# Altium footprint library PcbLib_ICs.PcbLib: 317 footprints (part 11 of 24)
Each footprint in its own frame and in the unit in brackets; x right, y up, seen from the top. Pads: shape width x height; smd on the part's side, far side on the other; paste and mask are expansions set on the pad; w line width, h text height; cw(c..) or ccw(c..) is an arc to the next point about the centre after c.
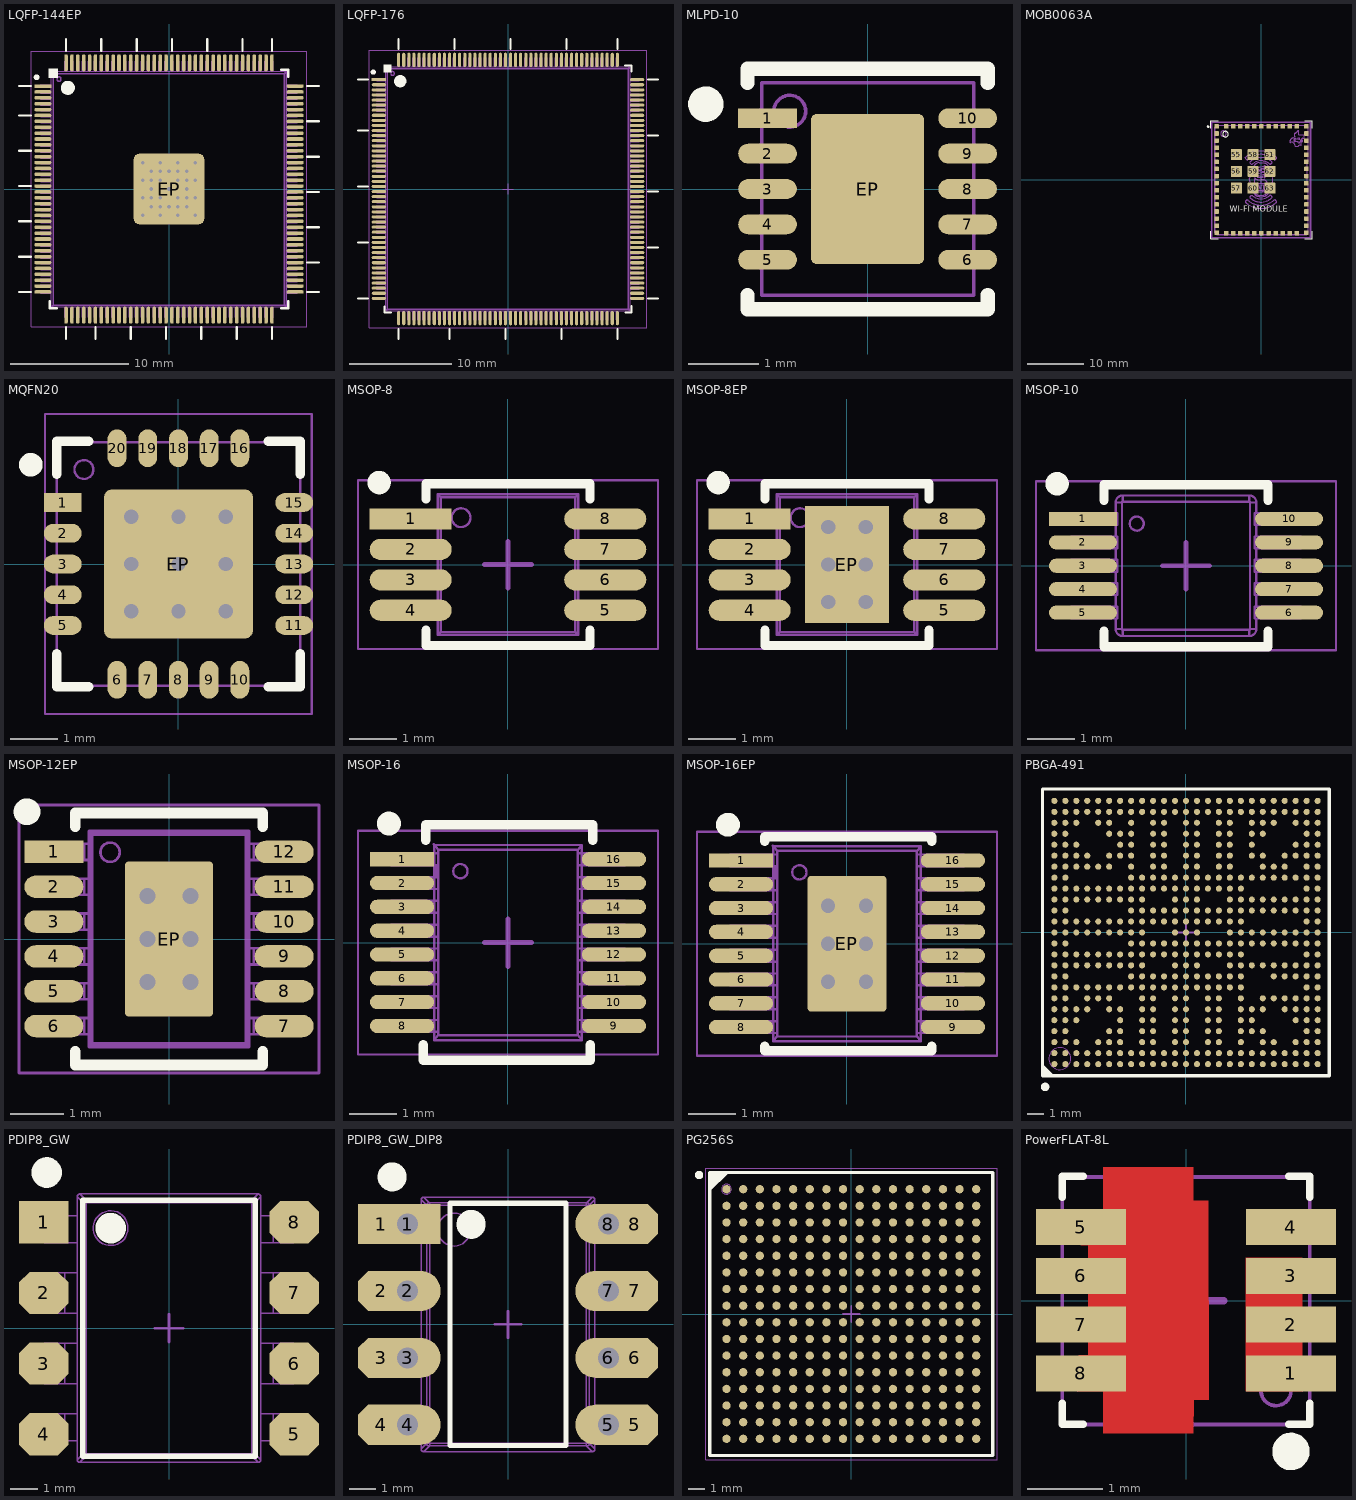
[diagram p10: the footprints below, top view; thin cyan lines are the x and y axes]

## LQFP-144EP [mm] "TSQFP, 144-Leads, Body 20,00x20,00mm, Pitch 0,50mm, IPC Medium Density"
height 1.6
pads (145):
  rect 1.45x0.3 smd paste+0 mask+0.08: 1(-10.725,8.75)
  oval 1.45x0.3 smd paste+0 mask+0.08: 2(-10.725,8.25) 3(-10.725,7.75) 4(-10.725,7.25) 5(-10.725,6.75) 6(-10.725,6.25) 7(-10.725,5.75) 8(-10.725,5.25) 9(-10.725,4.75) 10(-10.725,4.25) 11(-10.725,3.75) 12(-10.725,3.25) 13(-10.725,2.75) 14(-10.725,2.25) 15(-10.725,1.75) 16(-10.725,1.25) 17(-10.725,0.75) 18(-10.725,0.25) 19(-10.725,-0.25) 20(-10.725,-0.75) 21(-10.725,-1.25) 22(-10.725,-1.75) 23(-10.725,-2.25) 24(-10.725,-2.75) 25(-10.725,-3.25) 26(-10.725,-3.75) 27(-10.725,-4.25) 28(-10.725,-4.75) 29(-10.725,-5.25) 30(-10.725,-5.75) 31(-10.725,-6.25) 32(-10.725,-6.75) 33(-10.725,-7.25) 34(-10.725,-7.75) 35(-10.725,-8.25) 36(-10.725,-8.75) 73(10.725,-8.75) 74(10.725,-8.25) 75(10.725,-7.75) 76(10.725,-7.25) 77(10.725,-6.75) 78(10.725,-6.25) 79(10.725,-5.75) 80(10.725,-5.25) 81(10.725,-4.75) 82(10.725,-4.25) 83(10.725,-3.75) 84(10.725,-3.25) 85(10.725,-2.75) 86(10.725,-2.25) 87(10.725,-1.75) 88(10.725,-1.25) 89(10.725,-0.75) 90(10.725,-0.25) 91(10.725,0.25) 92(10.725,0.75) 93(10.725,1.25) 94(10.725,1.75) 95(10.725,2.25) 96(10.725,2.75) 97(10.725,3.25) 98(10.725,3.75) 99(10.725,4.25) 100(10.725,4.75) 101(10.725,5.25) 102(10.725,5.75) 103(10.725,6.25) 104(10.725,6.75) 105(10.725,7.25) 106(10.725,7.75) 107(10.725,8.25) 108(10.725,8.75)
  oval 0.3x1.45 smd paste+0 mask+0.08: 37(-8.75,-10.725) 38(-8.25,-10.725) 39(-7.75,-10.725) 40(-7.25,-10.725) 41(-6.75,-10.725) 42(-6.25,-10.725) 43(-5.75,-10.725) 44(-5.25,-10.725) 45(-4.75,-10.725) 46(-4.25,-10.725) 47(-3.75,-10.725) 48(-3.25,-10.725) 49(-2.75,-10.725) 50(-2.25,-10.725) 51(-1.75,-10.725) 52(-1.25,-10.725) 53(-0.75,-10.725) 54(-0.25,-10.725) 55(0.25,-10.725) 56(0.75,-10.725) 57(1.25,-10.725) 58(1.75,-10.725) 59(2.25,-10.725) 60(2.75,-10.725) 61(3.25,-10.725) 62(3.75,-10.725) 63(4.25,-10.725) 64(4.75,-10.725) 65(5.25,-10.725) 66(5.75,-10.725) 67(6.25,-10.725) 68(6.75,-10.725) 69(7.25,-10.725) 70(7.75,-10.725) 71(8.25,-10.725) 72(8.75,-10.725) 109(8.75,10.725) 110(8.25,10.725) 111(7.75,10.725) 112(7.25,10.725) 113(6.75,10.725) 114(6.25,10.725) 115(5.75,10.725) 116(5.25,10.725) 117(4.75,10.725) 118(4.25,10.725) 119(3.75,10.725) 120(3.25,10.725) 121(2.75,10.725) 122(2.25,10.725) 123(1.75,10.725) 124(1.25,10.725) 125(0.75,10.725) 126(0.25,10.725) 127(-0.25,10.725) 128(-0.75,10.725) 129(-1.25,10.725) 130(-1.75,10.725) 131(-2.25,10.725) 132(-2.75,10.725) 133(-3.25,10.725) 134(-3.75,10.725) 135(-4.25,10.725) 136(-4.75,10.725) 137(-5.25,10.725) 138(-5.75,10.725) 139(-6.25,10.725) 140(-6.75,10.725) 141(-7.25,10.725) 142(-7.75,10.725) 143(-8.25,10.725) 144(-8.75,10.725)
  rrect15% 6x6 smd paste-50 mask+0.08: EP(0,0)
via -1.5,0.75 diameter 0.7 hole 0.3
via -1.5,-0.75 diameter 0.7 hole 0.3
via -2.25,0.75 diameter 0.7 hole 0.3
via -0.75,2.25 diameter 0.7 hole 0.3
via -2.25,2.25 diameter 0.7 hole 0.3
via -2.25,-0.75 diameter 0.7 hole 0.3
via -0.75,-2.25 diameter 0.7 hole 0.3
via -2.25,-2.25 diameter 0.7 hole 0.3
via -1.5,-1.5 diameter 0.7 hole 0.3
via -0.75,-0.75 diameter 0.7 hole 0.3
via 0.75,-2.25 diameter 0.7 hole 0.3
via 2.25,-0.75 diameter 0.7 hole 0.3
via 2.25,-2.25 diameter 0.7 hole 0.3
via 1.5,-1.5 diameter 0.7 hole 0.3
via 0.75,-0.75 diameter 0.7 hole 0.3
via 2.25,0.75 diameter 0.7 hole 0.3
via 0.75,2.25 diameter 0.7 hole 0.3
via 2.25,2.25 diameter 0.7 hole 0.3
via 1.5,1.5 diameter 0.7 hole 0.3
via 0.75,0.75 diameter 0.7 hole 0.3
via 0,0 diameter 0.7 hole 0.3
via -0.75,-1.5 diameter 0.7 hole 0.3
via 0.75,-1.5 diameter 0.7 hole 0.3
via 1.5,-0.75 diameter 0.7 hole 0.3
via 1.5,0.75 diameter 0.7 hole 0.3
via 0.75,1.5 diameter 0.7 hole 0.3
via -0.75,1.5 diameter 0.7 hole 0.3
via 0,1.5 diameter 0.7 hole 0.3
via -1.5,0 diameter 0.7 hole 0.3
via 0,-1.5 diameter 0.7 hole 0.3
via 1.5,0 diameter 0.7 hole 0.3
via -0.75,0.75 diameter 0.7 hole 0.3
via -1.5,1.5 diameter 0.7 hole 0.3
Top Overlay:
  circle w0.25: c-11.25,9.5 r0.125
  circle w0.6: c-8.6,8.6 r0.3
  rectangle: -10.25,9.45 -9.45,10.25
  lines w0.2: -12.75,-8.75 -11.75,-8.75 ; -12.75,-5.75 -11.75,-5.75 ; -12.75,-2.75 -11.75,-2.75 ; -12.75,0.25 -11.75,0.25 ; -12.75,3.25 -11.75,3.25 ; -12.75,6.25 -11.75,6.25 ; -12.75,8.75 -11.75,8.75 ; -10.15,-9.55 -10.15,-10.15 -9.525,-10.15 ; -8.75,-12.75 -8.75,-11.75 ; -8.75,11.75 -8.75,12.75 ; -6.25,-12.75 -6.25,-11.75 ; -5.75,11.75 -5.75,12.75 ; -3.25,-12.75 -3.25,-11.75 ; -2.75,11.75 -2.75,12.75 ; -0.25,-12.75 -0.25,-11.75 ; 0.25,11.75 0.25,12.75 ; 2.75,-12.75 2.75,-11.75 ; 3.25,11.75 3.25,12.75 ; 5.75,-12.75 5.75,-11.75 ; 6.25,11.75 6.25,12.75 ; 8.75,-12.75 8.75,-11.75 ; 8.75,11.75 8.75,12.75 ; 9.525,10.15 10.15,10.15 10.15,9.55 ; 9.55,-10.15 10.15,-10.15 10.15,-9.525 ; 11.75,-8.75 12.75,-8.75 ; 11.75,-6.25 12.75,-6.25 ; 11.75,-3.25 12.75,-3.25 ; 11.75,-0.25 12.75,-0.25 ; 11.75,2.75 12.75,2.75 ; 11.75,5.75 12.75,5.75 ; 11.75,8.75 12.75,8.75
Top Paste:
  rectangle: 0.1,-0.7 0.7,-0.1
  rectangle: -0.7,-0.7 -0.1,-0.1
  rectangle: 0.1,0.1 0.7,0.7
  rectangle: -0.7,0.1 -0.1,0.7
  rectangle: -1.5,-0.7 -0.9,-0.1
  rectangle: -2.3,-0.7 -1.7,-0.1
  rectangle: -1.5,0.1 -0.9,0.7
  rectangle: -2.3,0.1 -1.7,0.7
  rectangle: 1.7,-0.7 2.3,-0.1
  rectangle: 0.9,-0.7 1.5,-0.1
  rectangle: 1.7,0.1 2.3,0.7
  rectangle: 0.9,0.1 1.5,0.7
  rectangle: -3.1,-0.7 -2.5,-0.1
  rectangle: -3.1,0.1 -2.5,0.7
  region: 3.1,0.7 2.5,0.7 2.5,0.1 3.1,0.1
  region: 3.1,-0.1 2.5,-0.1 2.5,-0.7 3.1,-0.7
  rectangle: 0.1,0.9 0.7,1.5
  rectangle: -0.7,0.9 -0.1,1.5
  rectangle: -1.5,0.9 -0.9,1.5
  rectangle: -2.3,0.9 -1.7,1.5
  rectangle: 1.7,0.9 2.3,1.5
  rectangle: 0.9,0.9 1.5,1.5
  rectangle: -3.1,0.9 -2.5,1.5
  region: 3.1,1.5 2.5,1.5 2.5,0.9 3.1,0.9
  rectangle: 0.1,1.7 0.7,2.3
  rectangle: -0.7,1.7 -0.1,2.3
  rectangle: -1.5,1.7 -0.9,2.3
  rectangle: -2.3,1.7 -1.7,2.3
  rectangle: 1.7,1.7 2.3,2.3
  rectangle: 0.9,1.7 1.5,2.3
  rectangle: -3.1,1.7 -2.5,2.3
  region: 3.1,2.3 2.5,2.3 2.5,1.7 3.1,1.7
  rectangle: 0.1,2.5 0.7,3.1
  rectangle: -0.7,2.5 -0.1,3.1
  rectangle: -1.5,2.5 -0.9,3.1
  rectangle: -2.3,2.5 -1.7,3.1
  rectangle: 1.7,2.5 2.3,3.1
  rectangle: 0.9,2.5 1.5,3.1
  rectangle: -3.1,2.5 -2.5,3.1
  region: 3.1,3.1 2.5,3.1 2.5,2.5 3.1,2.5
  region: -0.1,-0.9 -0.7,-0.9 -0.7,-1.5 -0.1,-1.5
  region: 0.7,-0.9 0.1,-0.9 0.1,-1.5 0.7,-1.5
  region: 1.5,-0.9 0.9,-0.9 0.9,-1.5 1.5,-1.5
  region: 2.3,-0.9 1.7,-0.9 1.7,-1.5 2.3,-1.5
  region: -1.7,-0.9 -2.3,-0.9 -2.3,-1.5 -1.7,-1.5
  region: -0.9,-0.9 -1.5,-0.9 -1.5,-1.5 -0.9,-1.5
  region: 3.1,-0.9 2.5,-0.9 2.5,-1.5 3.1,-1.5
  rectangle: -3.1,-1.5 -2.5,-0.9
  region: -0.1,-1.7 -0.7,-1.7 -0.7,-2.3 -0.1,-2.3
  region: 0.7,-1.7 0.1,-1.7 0.1,-2.3 0.7,-2.3
  region: 1.5,-1.7 0.9,-1.7 0.9,-2.3 1.5,-2.3
  region: 2.3,-1.7 1.7,-1.7 1.7,-2.3 2.3,-2.3
  region: -1.7,-1.7 -2.3,-1.7 -2.3,-2.3 -1.7,-2.3
  region: -0.9,-1.7 -1.5,-1.7 -1.5,-2.3 -0.9,-2.3
  region: 3.1,-1.7 2.5,-1.7 2.5,-2.3 3.1,-2.3
  rectangle: -3.1,-2.3 -2.5,-1.7
  region: -0.1,-2.5 -0.7,-2.5 -0.7,-3.1 -0.1,-3.1
  region: 0.7,-2.5 0.1,-2.5 0.1,-3.1 0.7,-3.1
  region: 1.5,-2.5 0.9,-2.5 0.9,-3.1 1.5,-3.1
  region: 2.3,-2.5 1.7,-2.5 1.7,-3.1 2.3,-3.1
  region: -1.7,-2.5 -2.3,-2.5 -2.3,-3.1 -1.7,-3.1
  region: -0.9,-2.5 -1.5,-2.5 -1.5,-3.1 -0.9,-3.1
  region: 3.1,-2.5 2.5,-2.5 2.5,-3.1 3.1,-3.1
  rectangle: -3.1,-3.1 -2.5,-2.5
Bottom Solder:
  region: -3.25,3.25 -0.5,3.25 0,2.75 0.5,3.25 3.25,3.25 3.25,0.5 2.75,0 3.25,-0.5 3.25,-3.25 0.5,-3.25 0,-2.75 -0.5,-3.25 -3.25,-3.25 -3.25,-0.5 -2.75,0 -3.25,0.5
Top Assy:
  drawing of 2361 lines, arcs and shapes, not listed
  text ".Designator" at -3.443,-0.467 h2
Top Text:
  lines w0.05: -11.7,-11.7 -11.7,11.7 11.7,11.7 11.7,-11.7 -11.7,-11.7
  lines w0.1: -0.5,0 0.5,0 ; 0,-0.5 0,0.5
3D body "LQFP144-0_5.STEP": height 1.58, standoff 0.01, extent -10.875,-10.872 10.897,10.9

## LQFP-176 [mm] "TSQFP, 176-Leads, Body 24,00x24,00mm, Pitch 0,50mm, IPC Medium Density"
height 1.6
pads (176):
  rect 1.4x0.3 smd paste+0 mask+0.08: 1(-12.7,10.75)
  oval 1.4x0.3 smd paste+0 mask+0.08: 2(-12.7,10.25) 3(-12.7,9.75) 4(-12.7,9.25) 5(-12.7,8.75) 6(-12.7,8.25) 7(-12.7,7.75) 8(-12.7,7.25) 9(-12.7,6.75) 10(-12.7,6.25) 11(-12.7,5.75) 12(-12.7,5.25) 13(-12.7,4.75) 14(-12.7,4.25) 15(-12.7,3.75) 16(-12.7,3.25) 17(-12.7,2.75) 18(-12.7,2.25) 19(-12.7,1.75) 20(-12.7,1.25) 21(-12.7,0.75) 22(-12.7,0.25) 23(-12.7,-0.25) 24(-12.7,-0.75) 25(-12.7,-1.25) 26(-12.7,-1.75) 27(-12.7,-2.25) 28(-12.7,-2.75) 29(-12.7,-3.25) 30(-12.7,-3.75) 31(-12.7,-4.25) 32(-12.7,-4.75) 33(-12.7,-5.25) 34(-12.7,-5.75) 35(-12.7,-6.25) 36(-12.7,-6.75) 37(-12.7,-7.25) 38(-12.7,-7.75) 39(-12.7,-8.25) 40(-12.7,-8.75) 41(-12.7,-9.25) 42(-12.7,-9.75) 43(-12.7,-10.25) 44(-12.7,-10.75) 89(12.7,-10.75) 90(12.7,-10.25) 91(12.7,-9.75) 92(12.7,-9.25) 93(12.7,-8.75) 94(12.7,-8.25) 95(12.7,-7.75) 96(12.7,-7.25) 97(12.7,-6.75) 98(12.7,-6.25) 99(12.7,-5.75) 100(12.7,-5.25) 101(12.7,-4.75) 102(12.7,-4.25) 103(12.7,-3.75) 104(12.7,-3.25) 105(12.7,-2.75) 106(12.7,-2.25) 107(12.7,-1.75) 108(12.7,-1.25) 109(12.7,-0.75) 110(12.7,-0.25) 111(12.7,0.25) 112(12.7,0.75) 113(12.7,1.25) 114(12.7,1.75) 115(12.7,2.25) 116(12.7,2.75) 117(12.7,3.25) 118(12.7,3.75) 119(12.7,4.25) 120(12.7,4.75) 121(12.7,5.25) 122(12.7,5.75) 123(12.7,6.25) 124(12.7,6.75) 125(12.7,7.25) 126(12.7,7.75) 127(12.7,8.25) 128(12.7,8.75) 129(12.7,9.25) 130(12.7,9.75) 131(12.7,10.25) 132(12.7,10.75)
  oval 0.3x1.4 smd paste+0 mask+0.08: 45(-10.75,-12.7) 46(-10.25,-12.7) 47(-9.75,-12.7) 48(-9.25,-12.7) 49(-8.75,-12.7) 50(-8.25,-12.7) 51(-7.75,-12.7) 52(-7.25,-12.7) 53(-6.75,-12.7) 54(-6.25,-12.7) 55(-5.75,-12.7) 56(-5.25,-12.7) 57(-4.75,-12.7) 58(-4.25,-12.7) 59(-3.75,-12.7) 60(-3.25,-12.7) 61(-2.75,-12.7) 62(-2.25,-12.7) 63(-1.75,-12.7) 64(-1.25,-12.7) 65(-0.75,-12.7) 66(-0.25,-12.7) 67(0.25,-12.7) 68(0.75,-12.7) 69(1.25,-12.7) 70(1.75,-12.7) 71(2.25,-12.7) 72(2.75,-12.7) 73(3.25,-12.7) 74(3.75,-12.7) 75(4.25,-12.7) 76(4.75,-12.7) 77(5.25,-12.7) 78(5.75,-12.7) 79(6.25,-12.7) 80(6.75,-12.7) 81(7.25,-12.7) 82(7.75,-12.7) 83(8.25,-12.7) 84(8.75,-12.7) 85(9.25,-12.7) 86(9.75,-12.7) 87(10.25,-12.7) 88(10.75,-12.7) 133(10.75,12.7) 134(10.25,12.7) 135(9.75,12.7) 136(9.25,12.7) 137(8.75,12.7) 138(8.25,12.7) 139(7.75,12.7) 140(7.25,12.7) 141(6.75,12.7) 142(6.25,12.7) 143(5.75,12.7) 144(5.25,12.7) 145(4.75,12.7) 146(4.25,12.7) 147(3.75,12.7) 148(3.25,12.7) 149(2.75,12.7) 150(2.25,12.7) 151(1.75,12.7) 152(1.25,12.7) 153(0.75,12.7) 154(0.25,12.7) 155(-0.25,12.7) 156(-0.75,12.7) 157(-1.25,12.7) 158(-1.75,12.7) 159(-2.25,12.7) 160(-2.75,12.7) 161(-3.25,12.7) 162(-3.75,12.7) 163(-4.25,12.7) 164(-4.75,12.7) 165(-5.25,12.7) 166(-5.75,12.7) 167(-6.25,12.7) 168(-6.75,12.7) 169(-7.25,12.7) 170(-7.75,12.7) 171(-8.25,12.7) 172(-8.75,12.7) 173(-9.25,12.7) 174(-9.75,12.7) 175(-10.25,12.7) 176(-10.75,12.7)
Top Overlay:
  circle w0.25: c-13.25,11.5 r0.125
  circle w0.6: c-10.6,10.6 r0.3
  rectangle: -12.25,11.45 -11.45,12.25
  lines w0.2: -14.75,-10.75 -13.75,-10.75 ; -14.75,-5.25 -13.75,-5.25 ; -14.75,0.25 -13.75,0.25 ; -14.75,5.75 -13.75,5.75 ; -14.75,10.75 -13.75,10.75 ; -12.15,-11.55 -12.15,-12.15 -11.525,-12.15 ; -10.75,-14.75 -10.75,-13.75 ; -10.75,13.75 -10.75,14.75 ; -5.75,-14.75 -5.75,-13.75 ; -5.25,13.75 -5.25,14.75 ; -0.25,-14.75 -0.25,-13.75 ; 0.25,13.75 0.25,14.75 ; 5.25,-14.75 5.25,-13.75 ; 5.75,13.75 5.75,14.75 ; 10.75,-14.75 10.75,-13.75 ; 10.75,13.75 10.75,14.75 ; 11.525,12.15 12.15,12.15 12.15,11.55 ; 11.55,-12.15 12.15,-12.15 12.15,-11.525 ; 13.75,-10.75 14.75,-10.75 ; 13.75,-5.75 14.75,-5.75 ; 13.75,-0.25 14.75,-0.25 ; 13.75,5.25 14.75,5.25 ; 13.75,10.75 14.75,10.75
Top Assy:
  drawing of 2873 lines, arcs and shapes, not listed
  text ".Designator" at -3.443,-0.467 h2
Top Text:
  lines w0.05: -13.65,-13.65 -13.65,13.65 13.65,13.65 13.65,-13.65 -13.65,-13.65
  lines w0.1: -0.5,0 0.5,0 ; 0,-0.5 0,0.5
3D body "LQFP176-0_5.STEP": height 1.58, standoff 0.01, extent -12.875,-12.872 12.897,12.9

## MLPD-10 [mm]
height 1
pads (11):
  rect 0.83x0.28 smd paste+0 mask+0.05: 1(-1.415,1)
  oval 0.83x0.28 smd paste+0 mask+0.05: 2(-1.415,0.5) 3(-1.415,0) 4(-1.415,-0.5) 5(-1.415,-1) 6(1.415,-1) 7(1.415,-0.5) 8(1.415,0) 9(1.415,0.5) 10(1.415,1)
  rrect10% 1.6x2.12 smd paste-50 mask+0.05: EP(0,0)
Top Overlay:
  circle w0.25: c-2.288,1.2 r0.125
  lines w0.2: -1.7,-1.5 -1.7,-1.7 1.7,-1.7 1.7,-1.5 ; -1.7,1.5 -1.7,1.7 1.7,1.7 1.7,1.5
Top Paste:
  rectangle: -0.7,-1.1 -0.1,-0.5
  rectangle: 0.1,-1.1 0.7,-0.5
  region: 0.7,1.1 0.1,1.1 0.1,0.5 0.7,0.5
  region: -0.1,1.1 -0.7,1.1 -0.7,0.5 -0.1,0.5
  rectangle: -0.7,-0.3 -0.1,0.3
  rectangle: 0.1,-0.3 0.7,0.3
Bottom Solder:
  region: -0.8,1.05 -0.125,1.05 0,0.925 0.125,1.05 0.8,1.05 0.8,0.15 0.675,0.025 0.8,-0.1 0.8,-1.05 0.125,-1.05 0,-0.925 -0.125,-1.05 -0.8,-1.05 -0.8,-0.1 -0.675,0.025 -0.8,0.15
Top Assy:
  circle w0.05: c-1.1,1.1 r0.225
  lines w0.05: -1.5,-1.115 -1.525,-1.115 -1.525,-0.885 -1.5,-0.885 ; -1.5,-0.615 -1.525,-0.615 -1.525,-0.385 -1.5,-0.385 ; -1.5,-0.115 -1.525,-0.115 -1.525,0.115 -1.5,0.115 ; -1.5,0.385 -1.525,0.385 -1.525,0.615 -1.5,0.615 ; -1.5,0.885 -1.525,0.885 -1.525,1.115 -1.5,1.115 ; 1.5,-1.115 1.525,-1.115 1.525,-0.885 1.5,-0.885 ; 1.5,-0.615 1.525,-0.615 1.525,-0.385 1.5,-0.385 ; 1.5,-0.115 1.525,-0.115 1.525,0.115 1.5,0.115 ; 1.5,0.385 1.525,0.385 1.525,0.615 1.5,0.615 ; 1.5,0.885 1.525,0.885 1.525,1.115 1.5,1.115 ; -1.5,-1.5 1.5,-1.5 1.5,1.5 -1.5,1.5 -1.5,-1.5
  text ".Designator" at -2.579,-0.349 h1.5
Top Text:
  lines w0.1: -0.5,0 0.5,0 ; 0,-0.5 0,0.5
3D body "MLPD-10.STEP": height 1, standoff 0, extent -1.525,-1.5 1.525,1.5

## MOB0063A [mm]
height 1.75
pads (63):
  rrect15% 0.81x0.81 smd paste+0 mask+0.08: 1(-8.05,9.55) 2(-8.05,8.28) 3(-8.05,7.01) 4(-8.05,5.74) 5(-8.05,4.47) 6(-8.05,3.2) 7(-8.05,1.93) 8(-8.05,0.66) 9(-8.05,-0.61) 10(-8.05,-1.88) 11(-8.05,-3.15) 12(-8.05,-4.42) 13(-8.05,-5.69) 14(-8.05,-6.96) 15(-8.05,-8.23) 16(-8.05,-9.5) 17(-6.35,-9.55) 18(-5.08,-9.55) 19(-3.81,-9.55) 20(-2.54,-9.55) 21(-1.27,-9.55) 22(0,-9.55) 23(1.27,-9.55) 24(2.54,-9.55) 25(3.81,-9.55) 26(5.08,-9.55) 27(6.35,-9.55) 28(8.05,-9.5) 29(8.05,-8.23) 30(8.05,-6.96) 31(8.05,-5.69) 32(8.05,-4.42) 33(8.05,-3.15) 34(8.05,-1.88) 35(8.05,-0.61) 36(8.05,0.66) 37(8.05,1.93) 38(8.05,3.2) 39(8.05,4.47) 40(8.05,5.74) 41(8.05,7.01) 42(8.05,8.28) 43(8.05,9.55) 44(6.35,9.55) 45(5.08,9.55) 46(3.81,9.55) 47(2.54,9.55) 48(1.27,9.55) 49(0,9.55) 50(-1.27,9.55) 51(-2.54,9.55) 52(-3.81,9.55) 53(-5.08,9.55) 54(-6.35,9.55)
  rrect15% 2x2 smd paste-50 mask+0.08: 55(-4.5,4.5) 56(-4.5,1.5) 57(-4.5,-1.5) 58(-1.5,4.5) 59(-1.5,1.5) 60(-1.5,-1.5) 61(1.5,4.5) 62(1.5,1.5) 63(1.5,-1.5)
via 1.5,-2.05 diameter 0.4 hole 0.2
via 2.05,-1.5 diameter 0.4 hole 0.2
via 1.5,-0.95 diameter 0.4 hole 0.2
via 0.95,-1.5 diameter 0.4 hole 0.2
via -1.5,-2.05 diameter 0.4 hole 0.2
via -0.95,-1.5 diameter 0.4 hole 0.2
via -1.5,-0.95 diameter 0.4 hole 0.2
via -2.05,-1.5 diameter 0.4 hole 0.2
via -4.5,-2.05 diameter 0.4 hole 0.2
via -3.95,-1.5 diameter 0.4 hole 0.2
via -4.5,-0.95 diameter 0.4 hole 0.2
via -5.05,-1.5 diameter 0.4 hole 0.2
via 1.5,0.95 diameter 0.4 hole 0.2
via 2.05,1.5 diameter 0.4 hole 0.2
via 1.5,2.05 diameter 0.4 hole 0.2
via 0.95,1.5 diameter 0.4 hole 0.2
via 1.5,3.95 diameter 0.4 hole 0.2
via 2.05,4.5 diameter 0.4 hole 0.2
via 1.5,5.05 diameter 0.4 hole 0.2
via 0.95,4.5 diameter 0.4 hole 0.2
via -1.5,0.95 diameter 0.4 hole 0.2
via -0.95,1.5 diameter 0.4 hole 0.2
via -1.5,2.05 diameter 0.4 hole 0.2
via -2.05,1.5 diameter 0.4 hole 0.2
via -4.5,0.95 diameter 0.4 hole 0.2
via -3.95,1.5 diameter 0.4 hole 0.2
via -4.5,2.05 diameter 0.4 hole 0.2
via -5.05,1.5 diameter 0.4 hole 0.2
via -1.5,3.95 diameter 0.4 hole 0.2
via -0.95,4.5 diameter 0.4 hole 0.2
via -1.5,5.05 diameter 0.4 hole 0.2
via -2.05,4.5 diameter 0.4 hole 0.2
via -4.5,3.95 diameter 0.4 hole 0.2
via -3.95,4.5 diameter 0.4 hole 0.2
via -4.5,5.05 diameter 0.4 hole 0.2
via -5.05,4.5 diameter 0.4 hole 0.2
Top Overlay:
  circle w0.25: c-9.55,9.5 r0.125
  circle w0.2: c-6.45,8.15 r0.5
  lines w0.2: -9.05,-9.25 -9.05,-10.55 -7.75,-10.55 ; -9.05,9.25 -9.05,10.55 -7.75,10.55 ; 7.75,-10.55 9.05,-10.55 9.05,-9.25 ; 7.75,10.55 9.05,10.55 9.05,9.25
  text "WI-FI MODULE" at -5.642,-6.077 h1.8
Top Paste:
  rectangle: -5.4,3.6 -4.6,4.4
  rectangle: -4.4,4.6 -3.6,5.4
  region: -3.6,4.4 -4.4,4.4 -4.4,3.6 -3.6,3.6
  rectangle: -5.4,4.6 -4.6,5.4
  rectangle: -2.4,3.6 -1.6,4.4
  rectangle: -1.4,4.6 -0.6,5.4
  region: -0.6,4.4 -1.4,4.4 -1.4,3.6 -0.6,3.6
  rectangle: -2.4,4.6 -1.6,5.4
  rectangle: 0.6,3.6 1.4,4.4
  rectangle: 1.6,4.6 2.4,5.4
  region: 2.4,4.4 1.6,4.4 1.6,3.6 2.4,3.6
  rectangle: 0.6,4.6 1.4,5.4
  rectangle: 0.6,0.6 1.4,1.4
  rectangle: 1.6,1.6 2.4,2.4
  region: 2.4,1.4 1.6,1.4 1.6,0.6 2.4,0.6
  rectangle: 0.6,1.6 1.4,2.4
  rectangle: -2.4,0.6 -1.6,1.4
  rectangle: -1.4,1.6 -0.6,2.4
  region: -0.6,1.4 -1.4,1.4 -1.4,0.6 -0.6,0.6
  rectangle: -2.4,1.6 -1.6,2.4
  rectangle: -5.4,0.6 -4.6,1.4
  rectangle: -4.4,1.6 -3.6,2.4
  region: -3.6,1.4 -4.4,1.4 -4.4,0.6 -3.6,0.6
  rectangle: -5.4,1.6 -4.6,2.4
  rectangle: -5.4,-2.4 -4.6,-1.6
  rectangle: -4.4,-1.4 -3.6,-0.6
  region: -3.6,-1.6 -4.4,-1.6 -4.4,-2.4 -3.6,-2.4
  rectangle: -5.4,-1.4 -4.6,-0.6
  rectangle: -2.4,-2.4 -1.6,-1.6
  rectangle: -1.4,-1.4 -0.6,-0.6
  region: -0.6,-1.6 -1.4,-1.6 -1.4,-2.4 -0.6,-2.4
  rectangle: -2.4,-1.4 -1.6,-0.6
  rectangle: 0.6,-2.4 1.4,-1.6
  rectangle: 1.6,-1.4 2.4,-0.6
  region: 2.4,-1.6 1.6,-1.6 1.6,-2.4 2.4,-2.4
  rectangle: 0.6,-1.4 1.4,-0.6
Top Solder:
  region: -3.57,5.575 -4.5,5.575 -5.575,4.5 -5.575,3.575 -5.425,3.425 -3.625,3.425 -3.425,3.625 -3.425,5.425
Top Assy:
  drawing of 1376 lines, arcs and shapes, not listed
  text ".Designator" at 4.3,5.162 h3
Top Text:
  lines w0.1: -0.5,0 0.5,0 ; 0,-0.5 0,0.5
3D body "CC3100MOD.STEP": height 2.44, standoff 0.01, extent -8.875,-10.37 8.875,10.38

## MQFN20 [mm] "PQFN, 20-Leads, Body 5.00x5.35mm, Pitch 0.65mm, Thermal Pad 3.15x3.15mm, IPC Medium Density"
height 1
pads (21):
  rect 0.8x0.4 smd paste+0 mask+0.05: 1(-2.45,1.3)
  oval 0.8x0.4 smd paste+0 mask+0.05: 2(-2.45,0.65) 3(-2.45,0) 4(-2.45,-0.65) 5(-2.45,-1.3) 11(2.45,-1.3) 12(2.45,-0.65) 13(2.45,0) 14(2.45,0.65) 15(2.45,1.3)
  oval 0.4x0.8 smd paste+0 mask+0.05: 6(-1.3,-2.45) 7(-0.65,-2.45) 8(0,-2.45) 9(0.65,-2.45) 10(1.3,-2.45) 16(1.3,2.45) 17(0.65,2.45) 18(0,2.45) 19(-0.65,2.45) 20(-1.3,2.45)
  rrect10% 3.15x3.15 smd paste-50 mask+0.05: EP(0,0)
via 0,-1 diameter 0.7 hole 0.3
via 1,0 diameter 0.7 hole 0.3
via 0,1 diameter 0.7 hole 0.3
via -1,0 diameter 0.7 hole 0.3
via -1,-1 diameter 0.7 hole 0.3
via 1,-1 diameter 0.7 hole 0.3
via 1,1 diameter 0.7 hole 0.3
via -1,1 diameter 0.7 hole 0.3
via 0,0 diameter 0.7 hole 0.3
Top Overlay:
  circle w0.25: c-3.125,2.1 r0.125
  lines w0.2: -2.575,-1.9 -2.575,-2.6 -1.9,-2.6 ; -2.575,1.9 -2.575,2.6 -1.9,2.6 ; 1.9,-2.6 2.575,-2.6 2.575,-1.9 ; 1.9,2.6 2.575,2.6 2.575,1.9
Top Paste:
  rectangle: 0.9,-1.5 1.5,-0.9
  rectangle: -1.5,-1.5 -0.9,-0.9
  rectangle: -0.7,-1.5 -0.1,-0.9
  rectangle: 0.1,-1.5 0.7,-0.9
  region: -0.9,1.5 -1.5,1.5 -1.5,0.9 -0.9,0.9
  region: 1.5,1.5 0.9,1.5 0.9,0.9 1.5,0.9
  region: 0.7,1.5 0.1,1.5 0.1,0.9 0.7,0.9
  region: -0.1,1.5 -0.7,1.5 -0.7,0.9 -0.1,0.9
  region: -0.9,0.7 -1.5,0.7 -1.5,0.1 -0.9,0.1
  region: 1.5,0.7 0.9,0.7 0.9,0.1 1.5,0.1
  region: 0.7,0.7 0.1,0.7 0.1,0.1 0.7,0.1
  region: -0.1,0.7 -0.7,0.7 -0.7,0.1 -0.1,0.1
  rectangle: 0.9,-0.7 1.5,-0.1
  rectangle: -1.5,-0.7 -0.9,-0.1
  rectangle: -0.7,-0.7 -0.1,-0.1
  rectangle: 0.1,-0.7 0.7,-0.1
Bottom Solder:
  region: -1.75,1.75 -0.3,1.75 0,1.45 0.3,1.75 1.75,1.749 1.75,0.3 1.45,0 1.75,-0.3 1.75,-1.75 0.3,-1.75 0,-1.45 -0.3,-1.75 -1.75,-1.75 -1.75,-0.3 -1.45,0 -1.75,0.3
Top Assy:
  circle w0.05: c-2,2 r0.2
  lines w0.05: -2.6,-1.425 -2.6,-1.175 ; -2.6,-0.775 -2.6,-0.525 ; -2.6,-0.125 -2.6,0.125 ; -2.6,0.525 -2.6,0.775 ; -2.6,1.175 -2.6,1.425 ; -1.425,-2.6 -1.175,-2.6 ; -1.425,2.6 -1.175,2.6 ; -0.775,-2.6 -0.525,-2.6 ; -0.775,2.6 -0.525,2.6 ; -0.125,-2.6 0.125,-2.6 ; -0.125,2.6 0.125,2.6 ; 0.525,-2.6 0.775,-2.6 ; 0.525,2.6 0.775,2.6 ; 1.175,-2.6 1.425,-2.6 ; 1.175,2.6 1.425,2.6 ; 2.6,-1.425 2.6,-1.175 ; 2.6,-0.775 2.6,-0.525 ; 2.6,-0.125 2.6,0.125 ; 2.6,0.525 2.6,0.775 ; 2.6,1.175 2.6,1.425 ; -2.575,-2.575 2.575,-2.575 2.575,2.575 -2.575,2.575 -2.575,-2.575
  text ".Designator" at -3.443,-0.467 h2
Top Text:
  lines w0.05: -2.825,-3.175 -2.825,3.175 2.825,3.175 2.825,-3.175 -2.825,-3.175
  lines w0.1: -0.5,0 0.5,0 ; 0,-0.5 0,0.5
3D body "MQFN-20.STEP": height 1.05, standoff 0, extent -2.525,-2.525 2.525,2.525

## MSOP-8 [mm] "TSOP, 8-Leads, Body 3.00x3.00mm, Pitch 0.65mm, IPC Medium Density"
height 1.1
pads (8):
  rect 1.75x0.45 smd paste+0 mask+0.05: 1(-2.075,0.975)
  oval 1.75x0.45 smd paste+0 mask+0.05: 2(-2.075,0.325) 3(-2.075,-0.325) 4(-2.075,-0.975) 5(2.075,-0.975) 6(2.075,-0.325) 7(2.075,0.325) 8(2.075,0.975)
Top Overlay:
  circle w0.25: c-2.75,1.75 r0.125
  lines w0.2: -1.75,-1.4 -1.75,-1.725 1.75,-1.725 1.75,-1.4 ; -1.75,1.4 -1.75,1.725 1.75,1.725 1.75,1.4
Top Assy:
  circle w0.05: c-1,1 r0.2
  lines w0.05: -2.1,-1.125 -2.5,-1.125 -2.5,-0.825 -2.1,-0.825 ; -2.1,-1.125 -2.1,-0.825 ; -2.1,-1.125 -2,-1.125 ; -2.1,-0.825 -2,-0.825 ; -2.1,-0.475 -2.5,-0.475 -2.5,-0.175 -2.1,-0.175 ; -2.1,-0.475 -2.1,-0.175 ; -2.1,-0.475 -2,-0.475 ; -2.1,-0.175 -2,-0.175 ; -2.1,0.175 -2.5,0.175 -2.5,0.475 -2.1,0.475 ; -2.1,0.175 -2.1,0.475 ; -2.1,0.175 -2,0.175 ; -2.1,0.475 -2,0.475 ; -2.1,0.825 -2.5,0.825 -2.5,1.125 -2.1,1.125 ; -2.1,0.825 -2.1,1.125 ; -2.1,0.825 -2,0.825 ; -2.1,1.125 -2,1.125 ; -2,-1.125 -2,-0.825 ; -2,-1.125 -1.8,-1.125 ; -2,-0.825 -1.8,-0.825 ; -2,-0.475 -2,-0.175 ; -2,-0.475 -1.8,-0.475 ; -2,-0.175 -1.8,-0.175 ; -2,0.175 -2,0.475 ; -2,0.175 -1.8,0.175 ; -2,0.475 -1.8,0.475 ; -2,0.825 -2,1.125 ; -2,0.825 -1.8,0.825 ; -2,1.125 -1.8,1.125 ; -1.8,-1.125 -1.5,-1.125 ; -1.8,-1.125 -1.8,-0.825 ; -1.8,-0.825 -1.5,-0.825 ; -1.8,-0.475 -1.5,-0.475 ; -1.8,-0.475 -1.8,-0.175 ; -1.8,-0.175 -1.5,-0.175 ; -1.8,0.175 -1.5,0.175 ; -1.8,0.175 -1.8,0.475 ; -1.8,0.475 -1.5,0.475 ; -1.8,0.825 -1.5,0.825 ; -1.8,0.825 -1.8,1.125 ; -1.8,1.125 -1.5,1.125 ; -1.5,-1.5 -1.5,-1.125 ; -1.5,-1.5 -1.438,-1.438 ; -1.5,-1.5 1.5,-1.5 ; -1.5,-1.125 -1.5,-0.825 ; -1.5,-0.825 -1.5,-0.475 ; -1.5,-0.475 -1.5,-0.175 ; -1.5,-0.175 -1.5,0.175 ; -1.5,0.175 -1.5,0.475 ; -1.5,0.475 -1.5,0.825 ; -1.5,0.825 -1.5,1.125 ; -1.5,1.125 -1.5,1.5 ; -1.5,1.5 -1.438,1.438 ; -1.5,1.5 1.5,1.5 ; -1.438,-1.438 -1.438,1.438 ; -1.438,-1.438 1.438,-1.438 ; -1.438,1.438 1.438,1.438 ; 1.438,-1.438 1.5,-1.5 ; 1.438,-1.438 1.438,1.438 ; 1.438,1.438 1.5,1.5 ; 1.5,-1.5 1.5,-1.125 ; 1.5,-1.125 1.5,-0.825 ; 1.5,-1.125 1.8,-1.125 ; 1.5,-0.825 1.5,-0.475 ; 1.5,-0.825 1.8,-0.825 ; 1.5,-0.475 1.5,-0.175 ; 1.5,-0.475 1.8,-0.475 ; 1.5,-0.175 1.8,-0.175 ; 1.5,-0.175 1.5,0.175 ; 1.5,0.175 1.5,0.475 ; 1.5,0.175 1.8,0.175 ; 1.5,0.475 1.5,0.825 ; 1.5,0.475 1.8,0.475 ; 1.5,0.825 1.5,1.125 ; 1.5,0.825 1.8,0.825 ; 1.5,1.125 1.5,1.5 ; 1.5,1.125 1.8,1.125 ; 1.8,-1.125 2,-1.125 ; 1.8,-1.125 1.8,-0.825 ; 1.8,-0.825 2,-0.825 ; 1.8,-0.475 2,-0.475 ; 1.8,-0.475 1.8,-0.175 ; 1.8,-0.175 2,-0.175 ; 1.8,0.175 2,0.175 ; 1.8,0.175 1.8,0.475 ; 1.8,0.475 2,0.475 ; 1.8,0.825 2,0.825 ; 1.8,0.825 1.8,1.125 ; 1.8,1.125 2,1.125 ; 2,-1.125 2,-0.825 ; 2,-1.125 2.1,-1.125 ; 2,-0.825 2.1,-0.825 ; 2,-0.475 2,-0.175 ; 2,-0.475 2.1,-0.475 ; 2,-0.175 2.1,-0.175 ; 2,0.175 2,0.475 ; 2,0.175 2.1,0.175 ; 2,0.475 2.1,0.475 ; 2,0.825 2,1.125 ; 2,0.825 2.1,0.825 ; 2,1.125 2.1,1.125 ; 2.1,-1.125 2.5,-1.125 2.5,-0.825 2.1,-0.825 ; 2.1,-1.125 2.1,-0.825 ; 2.1,-0.475 2.5,-0.475 2.5,-0.175 2.1,-0.175 ; 2.1,-0.475 2.1,-0.175 ; 2.1,0.175 2.5,0.175 2.5,0.475 2.1,0.475 ; 2.1,0.175 2.1,0.475 ; 2.1,0.825 2.5,0.825 2.5,1.125 2.1,1.125 ; 2.1,0.825 2.1,1.125